# Altium integrated library dvrk-s-pwm.IntLib: 54 symbols (continued)
## CRCW04020000Z0ED (continued)

## Fiducial
designator FID?  (value not drawn)
Fiducial mark.  There is nothing to buy or mount.; SymbolCreator: codlsc; SymbolVersion: 2009-11-4; CompType: Fiducial; Publisher: National Semiconductor; LatestRevisionDate: 2011-09-19; LatestRevisionNote: Added Alternate PartNumber and Alternate Manufacturer parameters to appropriate components.; ComponentLink1URL: Paste URL for datasheet here; Manufacturer: N/A; MountType: N/A; PackageReference: Fiducial; PartNumber: N/A; ClassName: FiducialMark
footprint Fiducial10-30
footprint Fiducial10-20
footprint Fiducial15-30
footprint Fiducial20-40
footprint Fiducial6.4-20
footprint Fiducial10-30_TopLayerKeepOutOnly
footprint Fiducial6.4-20_TopLayerKeepOutOnly
footprint Fiducial10-20_TopLayerKeepOutOnly
footprint Fiducial15-30_TopLayerKeepOutOnly
footprint Fiducial20-40_TopLayerKeepOutOnly

## fpga_dummy
designator FPGA?, comment Connect to FireWire FPGA
ClassName: noclearancecheck
footprint FPGA-dummy
part A pins: 3 IO1-1 (io), 4 IO1-2 (io), 5 IO1-3 (io), 6 IO1-4 (io), 7 IO1-5 (io), 8 IO1-6 (io), 9 IO1-7 (io), 10 IO1-8 (io), 11 IO1-9 (io), 12 IO1-10 (io), 13 IO1-11 (io), 15 IO1-12 (io), 16 IO1-13 (io), 17 IO1-14 (io), 18 IO1-15 (io), 19 IO1-16 (io), 20 IO1-17 (io), 21 IO1-18 (io), 22 IO1-19 (io), 23 IO1-20 (io), 24 IO1-21 (io), 25 IO1-22 (io), 27 IO1-23 (io), 28 IO1-24 (io), 29 IO1-25 (io), 30 IO1-26 (io), 31 IO1-27 (io), 32 IO1-28 (io), 33 IO1-29 (io), 34 IO1-30 (io), 35 IO1-31 (io), 36 IO1-32 (io)
part B pins: 47 IO2-1 (io), 48 IO2-2 (io), 49 IO2-3 (io), 50 IO2-4 (io), 51 IO2-5 (io), 52 IO2-6 (io), 53 IO2-7 (io), 54 IO2-8 (io), 55 IO2-9 (io), 56 IO2-10 (io), 57 IO2-11 (io), 58 IO2-12 (io), 60 IO2-13 (io), 61 IO2-14 (io), 62 IO2-15 (io), 63 IO2-16 (io), 64 IO2-17 (io), 65 IO2-18 (io), 66 IO2-19 (io), 67 IO2-20 (io), 68 IO2-21 (io), 69 IO2-22 (io), 70 IO2-23 (io), 71 IO2-24 (io), 72 IO2-25 (io), 74 IO2-26 (io), 75 IO2-27 (io), 76 IO2-28 (io), 77 IO2-29 (io), 78 IO2-30 (io), 79 IO2-31 (io), 80 IO2-32 (io), 81 IO2-33 (io), 82 IO2-34 (io), 83 IO2-35 (io), 84 IO2-36 (io), 85 IO2-37 (io), 86 IO2-38 (io)
part C pins: 1 GND (power), 2 GND (power), 14 GND (power), 26 GND (power), 37 GND (power), 38 GND (power), 39 3.3V-OUT (power), 40 3.3V-OUT (power), 41 5V-OUT (power), 42 5V-OUT (power), 43 GND (power), 44 GND (power), 45 GND (power), 46 GND (power), 59 GND (power), 73 GND (power), 87 GND (power), 88 GND (power)

## GRM155R70J105KA12J
designator C?, comment 1µF
CAP CER 1UF 6.3V X7R 0402; Part Number: GRM155R70J105KA12J; Manufacturer: Murata Electronics; Tolerance: ±10%; Value: 1µF; Applications: General Purpose; Capacitance: 1µF; ComponentLink1Description: Datasheet; ComponentLink1URL: https://search.murata.co.jp/Ceramy/image/img/A01X/G101/ENG/GRM155R70J105KA12-01.pdf; ComponentLink2Description: DigiKey Link; ComponentLink2URL: http://digikey.com/product-detail/en/murata-electronics/GRM155R70J105KA12J/490-13339-1-ND/5973350; Device Package: 0402 (1005 Metric); LastUpdated: 9/2/2020 1:02:22 AM; Lifecycle Status: Active; Minimum Order: 1; Mounting Type: Surface Mount, MLCC; Operating Temperature: -55°C ~ 125°C; Package / Case: 0402 (1005 Metric); Packaging: TapeAndReel; PartId: 2890; Part Status: Active; Price: 0.01; Series: GRM; Size / Dimension: 0.039" L x 0.020" W (1.00mm x 0.50mm); Supplier 1: DigiKey; Supplier Part Number 1: 490-13339-1-ND; Temperature Coefficient: X7R; Thickness (Max): 0.022" (0.55mm); Voltage - Rated: 6.3V
footprint CAP 0402_1005
footprint FP-GRM155-0_05-IPC_B
pins: 1, 2

## HEADER 2
designator J?, comment Supplier Part Number 1: A19423-ND  (hidden comment: Substitute with tyco 640457-2)
TE Connectivity MTA-100 Series, 2.54mm Pitch 2 Way 1 Row Straight PCB Header, Solder Termination, 5A; system: connector; Voltage Rating: 250V; Number of Contacts: 2; Plating Thickness: 3.81um; Shrouded: No (Without); Contact Resistance: 6mR; Gender: Male; Underplate Material: Nickel; Connector Type: Plug,Header,Pin; Connector System: Wire-to-Board; PCB Mount Retention: Without; PCB Mounting Orientation: Vertical; Contact Post Length: 3.56mm; PCB Thickness: 0.063inch; Approvals: CSA; Manufacturer: TE Connectivity; Manufacturer Part Number: 640457-2; Stock 1: 10901; Pricing 1: 1=0.14, 10=0.127, 100=0.0783, 500=0.06482, 1000=0.05672, 5000=0.04862, 10000=0.04727 (USD); Mount: Through Hole; Colour: White,Natural,Beige; Contact Plating: Tin; Min Operating Temperature: -67°C; Max Operating Temperature: 221°C; Packaging: Bulk; Fastening Type: Friction; Current Rating: 5A; Contact Gender: Male; Termination: Solder; Orientation: Right Angle; Contact Current Rating: 5A; Max Voltage Rating (AC): 250V; Contact Mating Length: 0.295inch; Termination Post Length: 3.56mm; Depth: 11.04mm; Radiation Hardening: No; Flammability Rating: UL94 V-0; ELV: Compliant; Lead Free: Lead Free; REACH SVHC: Unknown; ComponentLink1URL: https://datasheet.ciiva.com/709/eng-cd-640457-s2-709682.pdf; ComponentLink1Description: https://datasheet.ciiva.com/709/eng-cd-640457-s2-709682.pdf; ComponentLink2URL: https://datasheet.ciiva.com/14640/70083657-14640359.pdf; ComponentLink2Description: https://datasheet.ciiva.com/14640/70083657-14640359.pdf; ComponentLink3URL: https://datasheet.ciiva.com/3118/eng-ds-82056-mta-0608-3118505.pdf; ComponentLink3Description: https://datasheet.ciiva.com/3118/eng-ds-82056-mta-0608-3118505.pdf; ComponentLink4URL: https://datasheet.ciiva.com/11750/0900766b806a960f-11750281.pdf; ComponentLink4Description: https://datasheet.ciiva.com/11750/0900766b806a960f-11750281.pdf; ComponentLink5URL: https://datasheet.ciiva.com/30192/8852eng-ds-82056-mta-0608-30192537.pdf; ComponentLink5Description: https://datasheet.ciiva.com/30192/8852eng-ds-82056-mta-0608-30192537.pdf; ComponentLink6URL: https://datasheet.ciiva.com/16395/eng-ds-82056-mta-0608-16395963.pdf; ComponentLink6Description: https://datasheet.ciiva.com/16395/eng-ds-82056-mta-0608-16395963.pdf; ComponentLink7URL: https://datasheet.ciiva.com/25618/0900766b80e9e25b-25618125.pdf; ComponentLink7Description: https://datasheet.ciiva.com/25618/0900766b80e9e25b-25618125.pdf; ComponentLink8URL: https://datasheet.ciiva.com/16505/eng-ds-82056-mta-0608-16505423.pdf; ComponentLink8Description: https://datasheet.ciiva.com/16505/eng-ds-82056-mta-0608-16505423.pdf; ComponentLink9URL: https://datasheet.ciiva.com/16656/eng-ds-82056-mta-0608-16656527.pdf; ComponentLink9Description: https://datasheet.ciiva.com/16656/eng-ds-82056-mta-0608-16656527.pdf; RoHS: Yes; Category: Connectors; Stock 2: 28315; Pricing 2: 1=0.10000, 10=0.09400, 100=0.05800, 500=0.04802, 1000=0.04202, 5000=0.03601, 10000=0.03501 (USD); Contact Material: Copper Alloy; Color: Natural,White,Beige; Housing Color: Natural; Housing Material: Polyester; Contact Shape: Square; Number of Rows: 1; Package Quantity: 1; Number of Positions: 2; Backwall/Post Interruptions: No (Without); Contact Retention: No (Without); Mating Alignment: No (Without); Mating Retention: No (Without); PCB Mount Alignment: No (Without); Sealable: No (Without); Strain Relief: No (Without); Contact Style: Straight; Series: MTA-100; Contact Type: Male Pin; Length: 5.08mm; Height: 7.75mm; Pitch: 2.54mm; Tail Length: 3.56mm; RoHS Compliant: Yes; ComponentLink10URL: https://datasheet.ciiva.com/15175/getdatasheetpartid-46749-15175703.pdf?src-supplier=Verical; ComponentLink10Description: https://datasheet.ciiva.com/15175/getdatasheetpartid-46749-15175703.pdf?src-supplier=Verical; ComponentLink11URL: https://datasheet.ciiva.com/16394/eng-ds-82056-mta-0608-16394202.pdf?src-supplier=Future+Electronics; ComponentLink11Description: https://datasheet.ciiva.com/16394/eng-ds-82056-mta-0608-16394202.pdf?src-supplier=Future+Electronics; ComponentLink12URL: https://datasheet.ciiva.com/6045/1650873-6045536.pdf?src-supplier=Farnell; ComponentLink12Description: https://datasheet.ciiva.com/6045/1650873-6045536.pdf?src-supplier=Farnell; ComponentLink13URL: https://datasheet.ciiva.com/11746/0900766b806b3bd3-11746906.pdf?src-supplier=RSComponents; ComponentLink13Description: https://datasheet.ciiva.com/11746/0900766b806b3bd3-11746906.pdf?src-supplier=RSComponents; ComponentLink14URL: https://datasheet.ciiva.com/7703/eng-ds-82056-mta-0608-7703518.pdf?src-supplier=Element14; ComponentLink14Description: https://datasheet.ciiva.com/7703/eng-ds-82056-mta-0608-7703518.pdf?src-supplier=Element14; ComponentLink15URL: https://datasheet.ciiva.com/3118/eng-ds-82056-mta-0608-3118490.pdf?src-supplier=Avnet; ComponentLink15Description: https://datasheet.ciiva.com/3118/eng-ds-82056-mta-0608-3118490.pdf?src-supplier=Avnet; ComponentLink16URL: https://datasheet.ciiva.com/709/eng-cd-640454-y2-709679.pdf?src-supplier=Digi-Key; ComponentLink16Description: https://datasheet.ciiva.com/709/eng-cd-640454-y2-709679.pdf?src-supplier=Digi-Key; ComponentLink17URL: https://datasheet.ciiva.com/16684/eng-ds-82056-mta-0608-16684984.pdf?src-supplier=Avnet+Europe; ComponentLink17Description: https://datasheet.ciiva.com/16684/eng-ds-82056-mta-0608-16684984.pdf?src-supplier=Avnet+Europe; Supplier 1: Digi-Key
footprint HDR-2x1-100 (Footprint not found)
pins: 1, 2

## HEADER 3
designator J?  (value not drawn)
footprint HDR-3x1-100 (Footprint not found)
pins: 1, 2, 3

## INA240A1PW
designator U?  Supplier Part Number 1: 296-45089-1-ND  Supplier Part Number 2: 595-INA240A1PWR
TEXAS INSTRUMENTS - INA240A1PWR . - CURRENT SENSE AMPLIFIER, 400KHZ, TSSOP-8; SymbolCreator: Altium; CompType: IC; U/M: EA; Number of Circuits: 1; Slew Rate: 2V/µs; Input Bias Current: 90uA; Input Offset Voltage (Vos): 5uV; Operating Supply Current: 1.8mA; SymbolVersion: 2016-01-07; PartNumber: INA240A1PW; PackageReference: PW0008A; MountType: SMT; ComponentLink1Description: Datasheet Link; ComponentLink1URL: https://sps06.itg.ti.com/sites/KMS/crossdivteams/altium/docs/ComponentDatasheets/INA240 Prelim DS - 9-15-15.pdf; Publisher: Texas Instruments; LatestRevisionDate: 2016-03-14; Manufacturer: Texas Instruments; Alternate Manufacturer: Texas Instruments; Manufacturer Part Number: INA240A1PWR; Category: Amplifiers - Op Amps, Buffer, Instrumentation; Stock 1: 14825; Pricing 1: 1=2.78000, 10=2.50000, 50=2.37000, 100=1.95000, 1000=1.40000, 10000=1.34000 (USD); Mount: Surface Mount; Case/Package: TSSOP; Min Operating Temperature: -40°C; Max Operating Temperature: 125°C; Packaging: Tape and Reel; -3db Bandwidth: 400kHz; RoHS Compliant: Yes; Lead Free: Lead Free; ComponentLink2URL: http://www.ti.com/lit/ds/symlink/ina240.pdf?src-supplier=Farnell; ComponentLink2Description: http://www.ti.com/lit/ds/symlink/ina240.pdf?src-supplier=Farnell; ComponentLink3URL: http://www.ti.com/lit/ds/symlink/ina240.pdf?src-supplier=Digi-Key; ComponentLink3Description: http://www.ti.com/lit/ds/symlink/ina240.pdf?src-supplier=Digi-Key; ComponentLink4URL: http://www.ti.com/lit/ds/symlink/ina240.pdf?src-supplier=Newark; ComponentLink4Description: http://www.ti.com/lit/ds/symlink/ina240.pdf?src-supplier=Newark; Supplier 1: Digi-Key; Supplier 2: Mouser
footprint PW0008A_N (SOP, 8-Leads, Body 4.5x3.1mm, Pitch 0.65mm, IPC Medium Density)
footprint PW0008A_M
footprint PW0008A_L
pins: 1 GND (power), 2 IN+ (in), 3 IN- (in), 4 GND (power), 5 VS (power), 6 REF2 (in), 7 REF1 (in), 8 OUT (out)

## Ind_0805
designator L?  value 100nH  Supplier Part Number 1: SRP1770TA-101MCT-ND
FIXED IND 100UH 5.3A 118 MOHM; Manufacturer: TDK; Manufacturer Part Number: MPZ2012S300AT000; Core Material: Ferrite; Impedance: 30R; Current Rating: 6A; DC Resistance (DCR): 10mR; Saturation Current: 6.5A; Shielding: Shielded; Self Resonant Frequency: 2MHz; Test Frequency: 100kHz; Tolerance: 20%; Stock 1: 117704; Pricing 1: 1=0.11, 10=0.091, 25=0.0704, 50=0.0584, 100=0.0503, 250=0.04028, 500=0.03624, 1000=0.0302 (USD); Mount: Surface Mount; Case/Package: 0805; Number of Pins: 3; Case Code (Metric): 2012; Case Code (Imperial): 0805; Packaging: Tape and Reel; Package Quantity: 1; Max DC Current: 6A; Length: 0.079inch; Height: 0.041inch; Width: 0.049inch; Depth: 1.25mm; REACH SVHC: No SVHC; Lead Free: Lead Free; ComponentLink1URL: https://datasheet.ciiva.com/46381/1750041-46381644.pdf; ComponentLink1Description: https://datasheet.ciiva.com/46381/1750041-46381644.pdf; ComponentLink2URL: https://datasheet.ciiva.com/48682/beads-commercial-power-mpz-en-48682508.pdf; ComponentLink2Description: https://datasheet.ciiva.com/48682/beads-commercial-power-mpz-en-48682508.pdf; ComponentLink3URL: https://datasheet.ciiva.com/8077/55169-8077085.pdf; ComponentLink3Description: https://datasheet.ciiva.com/8077/55169-8077085.pdf; ComponentLink4URL: https://datasheet.ciiva.com/8077/55169-8077086.pdf; ComponentLink4Description: https://datasheet.ciiva.com/8077/55169-8077086.pdf; ComponentLink5URL: https://datasheet.ciiva.com/46634/beads-commercial-power-mpz-en-46634590.pdf; ComponentLink5Description: https://datasheet.ciiva.com/46634/beads-commercial-power-mpz-en-46634590.pdf; ComponentLink6URL: https://datasheet.ciiva.com/46634/beads-commercial-power-mpz-en-46634367.pdf; ComponentLink6Description: https://datasheet.ciiva.com/46634/beads-commercial-power-mpz-en-46634367.pdf; RoHS: Yes; Category: Fixed Inductors; Stock 2: 17; Pricing 2: 1=4.17000, 10=3.82200, 25=3.47520, 50=2.91900, 100=2.50200 (USD); Min Operating Temperature: -40°C; Max Operating Temperature: 150°C; Resistor Type: Wirewound; Inductance: 100uH; RMS Current (Irms): 5.3A; Inductance Tolerance: 20%; Height - Seated (Max): 0.276inch; Ratings: AEC-Q200; RoHS Compliant: Yes; ComponentLink7URL: http://www.farnell.com/datasheets/2360566.pdf?src-supplier=Farnell; ComponentLink7Description: http://www.farnell.com/datasheets/2360566.pdf?src-supplier=Farnell; ComponentLink8URL: http://www.farnell.com/datasheets/1955470.pdf?src-supplier=Element14; ComponentLink8Description: http://www.farnell.com/datasheets/1955470.pdf?src-supplier=Element14; ComponentLink9URL: http://www.bourns.com/docs/Product-Datasheets/SRP1770TA.pdf?src-supplier=Digi-Key; ComponentLink9Description: http://www.bourns.com/docs/Product-Datasheets/SRP1770TA.pdf?src-supplier=Digi-Key; ComponentLink10URL: https://www.bourns.com/docs/Product-Datasheets/SRP1770TA.pdf?src-supplier=Digi-Key; ComponentLink10Description: https://www.bourns.com/docs/Product-Datasheets/SRP1770TA.pdf?src-supplier=Digi-Key; Supplier 1: Digi-Key
footprint SRP1770TA (Precision Wire Wound Inductor, 2-Leads, Body 16.90x16.90mm, IPC Medium Density)
pins: 1, 2

## LED_0402
designator D?  (value not drawn)
LED
footprint ROHM-SML-P11MT_V (SMD, 2-Leads, Body 0.6x1mm)
footprint LED_0402_BLUE
footprint LED_0402_ORANGE
footprint LED_0402_YELLOW
footprint LED_0402_GREEN
pins: 1 A, 2 K

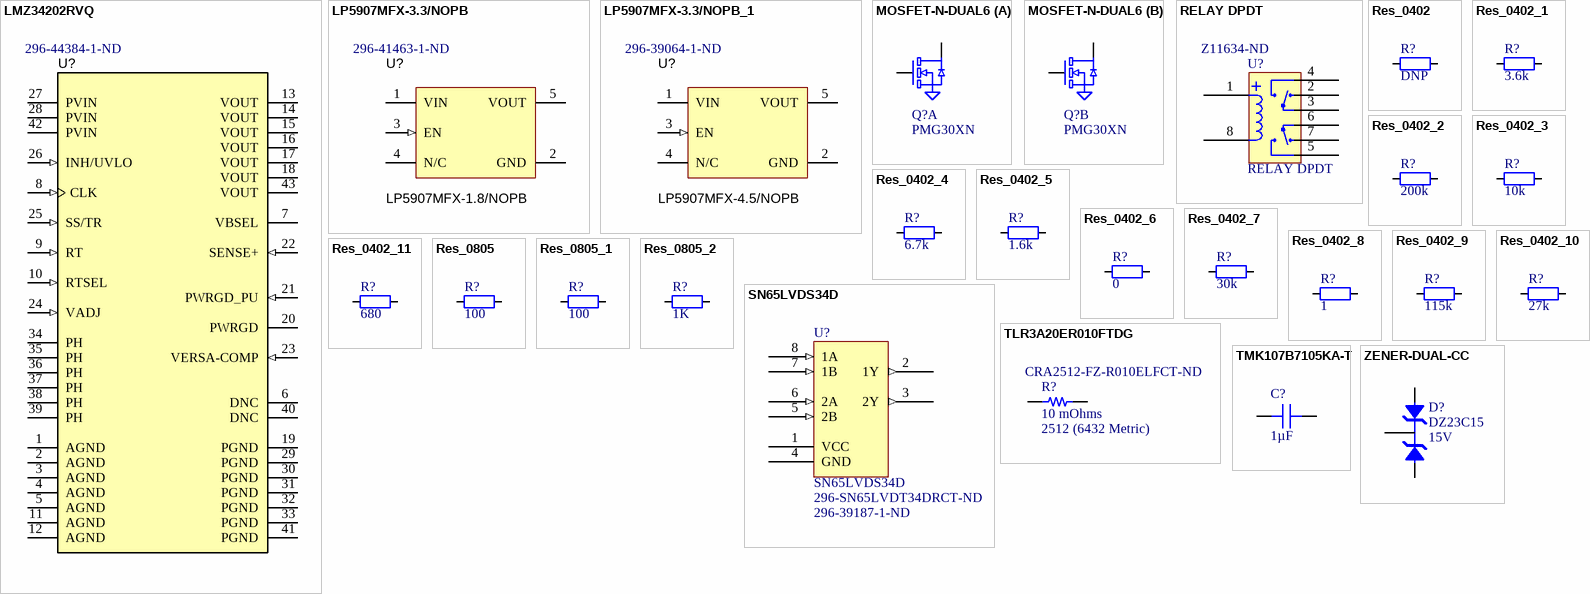
[diagram p1: symbols LMZ34202RVQ to ZENER-DUAL-CC]

## LMZ34202RVQ
designator U?  Supplier Part Number 1: 296-44384-1-ND
SIMPLE SWITCHER 4.5-V to 42-V Input, 2-A Power Module, RVQ00043A (B3QFN-43); PartNumber: LMZ34202RVQ; Manufacturer: Texas Instruments; Manufacturer Part Number: LMZ34202RVQT; SymbolCreator: Altium; SizeArea_mm2: 100; SizeAreaWB_mm2: 144; SizeX_mm: 10; SizeZ_mm: 4.4; CompType: IC; U/M: EA; Number of Outputs: 1; Min Input Voltage: 4.5V; Max Input Voltage: 42V; Voltage - Output 1: 7.5V; Max Output Current: 2A; Efficiency: 92%; SymbolVersion: 2015-09-17; PackageReference: RVQ0043A; PackageDescription: B3QFN-43; MountType: SMT; SizeY_mm: 10; ComponentLink1Description: Datasheet Link; ComponentLink1URL: https://sps06.itg.ti.com/sites/KMS/crossdivteams/altium/docs/ComponentDatasheets/lmz34202word.pdf; Publisher: Texas Instruments; LatestRevisionDate: 2016-12-29; Alternate Manufacturer: Texas Instruments; Supplier 1: Digi-Key; Stock 1: 1340; Pricing 1: 1=8.39, 5=8.27, 10=8.151, 25=7.9112, 50=7.6714, 100=7.4317 (USD); Mount: Surface Mount; Case/Package: QFN; Number of Pins: 43; Min Operating Temperature: -40°C; Max Operating Temperature: 105°C; Packaging: Cut Tape; Features: UVLO; Length: 0.39inch; Height: 0.17inch; Width: 0.39inch; Lead Free: Lead Free; REACH SVHC: No SVHC; ComponentLink2URL: http://www.ti.com/lit/ds/symlink/lmz34202.pdf; ComponentLink2Description: http://www.ti.com/lit/ds/symlink/lmz34202.pdf; ComponentLink3URL: http://www.ti.com/general/docs/lit/getliterature.tsp?genericPartNumber=LMZ34202&&fileType=pdf; ComponentLink3Description: http://www.ti.com/general/docs/lit/getliterature.tsp?genericPartNumber=LMZ34202&&fileType=pdf
footprint RVQ0043A
footprint RVQ0043A_NV
pins: 1 AGND (power), 2 AGND (power), 3 AGND (power), 4 AGND (power), 5 AGND (power), 6 DNC, 7 VBSEL (power), 8 CLK (in), 9 RT (in), 10 RTSEL (in), 11 AGND (power), 12 AGND (power), 13 VOUT (power), 14 VOUT (power), 15 VOUT (power), 16 VOUT (power), 17 VOUT (power), 18 VOUT (power), 19 PGND (power), 20 PWRGD (oc), 21 PWRGD_PU (in), 22 SENSE+ (in), 23 VERSA-COMP (in), 24 VADJ (in), 25 SS/TR (in), 26 INH/UVLO (in), 27 PVIN (power), 28 PVIN (power), 29 PGND (power), 30 PGND (power), 31 PGND (power), 32 PGND (power), 33 PGND (power), 34 PH (power), 35 PH (power), 36 PH (power), 37 PH (power), 38 PH (power), 39 PH (power), 40 DNC, 41 PGND (power), 42 PVIN (power), 43 VOUT (power)
1 alternate drawing of the same symbol

## LP5907MFX-3.3/NOPB
designator U?, comment LP5907MFX-1.8/NOPB  Supplier Part Number 1: 296-41463-1-ND
Ultra Low Noise, 250mA Linear Regulator; Manufacturer: Texas Instruments; SymbolCreator: a0799628; SizeArea_mm2: 8.12; SizeAreaWB_mm2: 14.82; SizeX_mm: 2.8; SizeY_mm: 2.9; SizeZ_mm: 1.45; CompType: IC; U/M: EA; Min Input Voltage: 2.2V; Number of Outputs: 1; Output Voltage: 1.8V; Dropout Voltage: 250mV; Max Input Voltage: 5.5V; Polarity: Positive; Quiescent Current: 25uA; Output Voltage Accuracy: 2%; Power Supply Rejection Ratio (PSRR): 82dB; Output Type: Fixed; SymbolVersion: 2014-03-21; PartNumber: LP5907MFX-1.8/NOPB; PackageReference: DBV0005A; PackageDescription: SOT-5; MountType: SMT; ComponentLink1Description: Datasheet Link; ComponentLink1URL: http://www.ti.com/lit/ds/symlink/lp5907.pdf; RoHS: Y; Publisher: Texas Instruments; LatestRevisionDate: 2016-09-20; Alternate Manufacturer: Texas Instruments; Supplier 1: Digi-Key; Manufacturer Part Number: LP5907MFX-1.8/NOPB; Category: Voltage Regulators - Linear; Stock 1: 17882; Pricing 1: 1=0.57000, 10=0.48900, 25=0.45640, 100=0.33900, 250=0.28684, 500=0.27380, 1000=0.20209 (USD); Mount: Surface Mount; Case/Package: SOT-23; Number of Pins: 5; Contact Plating: Tin; Min Operating Temperature: -40°C; Max Operating Temperature: 125°C; Packaging: Tape and Reel; Package Quantity: 3000; Output Current: 250mA; Number of Regulators: 1; Nominal Output Voltage: 1.8V; Accuracy: 2%; Max Output Current: 250mA; REACH SVHC: No SVHC; Lead Free: Lead Free; RoHS Compliant: Yes; ComponentLink2URL: https://datasheet.ciiva.com/15083/lp5907-15083594.pdf?src-supplier=Digi-Key; ComponentLink2Description: https://datasheet.ciiva.com/15083/lp5907-15083594.pdf?src-supplier=Digi-Key
footprint DBV0005A_N
footprint DBV0005A_M
footprint DBV0005A_L
pins: 1 VIN (power), 2 GND (power), 3 EN (in), 4 N/C, 5 VOUT (power)
1 alternate drawing of the same symbol

## LP5907MFX-3.3/NOPB_1
designator U?, comment LP5907MFX-4.5/NOPB  Supplier Part Number 1: 296-39064-1-ND
IC REG LINEAR 4.5V 250MA SOT23-5; Manufacturer: Texas Instruments; SymbolCreator: a0799628; SizeArea_mm2: 8.12; SizeAreaWB_mm2: 14.82; SizeX_mm: 2.8; SizeY_mm: 2.9; SizeZ_mm: 1.45; U/M: EA; Dropout Voltage: 250mV; Max Input Voltage: 5.5V; Min Input Voltage: 2.2V; Number of Outputs: 1; Polarity: Positive; Quiescent Current: 25uA; Output Voltage Accuracy: 2%; Power Supply Rejection Ratio (PSRR): 82dB; Output Type: Fixed; SymbolVersion: 2014-03-21; PartNumber: LP5907MFX-4.5/NOPB; PackageReference: DBV0005A; PackageDescription: SOT-5; MountType: SMT; ComponentLink1Description: Datasheet Link; ComponentLink1URL: http://www.ti.com/lit/ds/symlink/lp5907.pdf; CompType: IC; RoHS: Y; Publisher: Texas Instruments; LatestRevisionDate: 2016-09-20; Alternate Manufacturer: Texas Instruments; Supplier 1: Digi-Key; Manufacturer Part Number: LP5907MFX-4.5/NOPB; Category: Voltage Regulators - Linear; Stock 1: 15040; Pricing 1: 1=0.57000, 10=0.48900, 25=0.45640, 100=0.33900, 250=0.28684, 500=0.27380, 1000=0.20209 (USD); Mount: Surface Mount; Case/Package: SOT-23; Number of Pins: 5; Contact Plating: Tin; Min Operating Temperature: -40°C; Max Operating Temperature: 125°C; Output Voltage: 4.5V; Output Current: 250mA; Packaging: Tape and Reel; Package Quantity: 3000; Number of Regulators: 1; Nominal Output Voltage: 4.5V; Accuracy: 2%; Max Output Current: 250mA; REACH SVHC: No SVHC; Lead Free: Lead Free; RoHS Compliant: Yes; ComponentLink2URL: https://datasheet.ciiva.com/15083/lp5907-15083593.pdf?src-supplier=Digi-Key; ComponentLink2Description: https://datasheet.ciiva.com/15083/lp5907-15083593.pdf?src-supplier=Digi-Key
footprint DBV0005A_N
footprint DBV0005A_M
footprint DBV0005A_L
pins: 1 VIN (power), 2 GND (power), 3 EN (in), 4 N/C, 5 VOUT (power)
1 alternate drawing of the same symbol

## MOSFET-N-DUAL6
designator Q?, comment PMG30XN
footprint SC70-6
footprint SC-70-6 (Footprint not found)
part A pins: 1 S1 hidden to GND, 2 G1, 6 D1
part B pins: 3 D2, 4 S2 hidden to GND, 5 G2
1 alternate drawing of the same symbol

## RELAY DPDT
designator U?  Supplier Part Number 1: Z11634-ND
Supplier 1: Digi-Key
footprint FP-G6K-2G_DC5-MFG
pins: 1 COIL+, 2 NC, 3 COM, 4 NO, 5 NO, 6 COM, 7 NC, 8 COIL-
1 alternate drawing of the same symbol

## Res_0402
designator R?  value DNP  (hidden comment: Res_0402)
Resistor
footprint RESC1005X40X25NL05T05 (Chip Resistor, 2-Leads, Body 1.05x0.55mm, IPC Medium Density)
footprint FP-CRCW0402-e3-IPC_B
pins: 1, 2

## Res_0402_1
designator R?, comment value 3.6k  (hidden comment: Res_0402)
Resistor
footprint RESC1005X40X25NL05T05 (Chip Resistor, 2-Leads, Body 1.05x0.55mm, IPC Medium Density)
footprint FP-CRCW0402-e3-IPC_B
pins: 1, 2

## Res_0402_2
designator R?, comment value 200k  (hidden comment: Res_0402)
Resistor
footprint RESC1005X40X25NL05T05 (Chip Resistor, 2-Leads, Body 1.05x0.55mm, IPC Medium Density)
footprint FP-CRCW0402-e3-IPC_B
pins: 1, 2

## Res_0402_3
designator R?, comment value 10k  (hidden comment: Res_0402)
Resistor
footprint RESC1005X40X25NL05T05 (Chip Resistor, 2-Leads, Body 1.05x0.55mm, IPC Medium Density)
footprint FP-CRCW0402-e3-IPC_B
pins: 1, 2

## Res_0402_4
designator R?, comment value 6.7k  (hidden comment: Res_0402)
Resistor
footprint RESC1005X40X25NL05T05 (Chip Resistor, 2-Leads, Body 1.05x0.55mm, IPC Medium Density)
footprint FP-CRCW0402-e3-IPC_B
pins: 1, 2

## Res_0402_5
designator R?, comment value 1.6k  (hidden comment: Res_0402)
Resistor
footprint RESC1005X40X25NL05T05 (Chip Resistor, 2-Leads, Body 1.05x0.55mm, IPC Medium Density)
footprint FP-CRCW0402-e3-IPC_B
pins: 1, 2

## Res_0402_6
designator R?, comment value 0  (hidden comment: Res_0402)
Resistor
footprint RESC1005X40X25NL05T05 (Chip Resistor, 2-Leads, Body 1.05x0.55mm, IPC Medium Density)
footprint FP-CRCW0402-e3-IPC_B
pins: 1, 2

## Res_0402_7
designator R?, comment value 30k  (hidden comment: Res_0402)
Resistor
footprint RESC1005X40X25NL05T05 (Chip Resistor, 2-Leads, Body 1.05x0.55mm, IPC Medium Density)
footprint FP-CRCW0402-e3-IPC_B
pins: 1, 2

## Res_0402_8
designator R?, comment value 1  (hidden comment: Res_0402)
Resistor
footprint RESC1005X40X25NL05T05 (Chip Resistor, 2-Leads, Body 1.05x0.55mm, IPC Medium Density)
footprint FP-CRCW0402-e3-IPC_B
pins: 1, 2

## Res_0402_9
designator R?, comment value 115k  (hidden comment: Res_0402)
Resistor
footprint RESC1005X40X25NL05T05 (Chip Resistor, 2-Leads, Body 1.05x0.55mm, IPC Medium Density)
footprint FP-CRCW0402-e3-IPC_B
pins: 1, 2

## Res_0402_10
designator R?, comment value 27k  (hidden comment: Res_0402)
Resistor
footprint RESC1005X40X25NL05T05 (Chip Resistor, 2-Leads, Body 1.05x0.55mm, IPC Medium Density)
footprint FP-CRCW0402-e3-IPC_B
pins: 1, 2

## Res_0402_11
designator R?, comment value 680  (hidden comment: Res_0402)
Resistor
footprint RESC1005X40X25NL05T05 (Chip Resistor, 2-Leads, Body 1.05x0.55mm, IPC Medium Density)
footprint FP-CRCW0402-e3-IPC_B
pins: 1, 2

## Res_0805
designator R?  value 100  (hidden comment: Res_0805)
Resistor
footprint RESC2013X60X40NL20T25 (Chip Resistor, 2-Leads, Body 2.00x1.25mm, IPC Medium Density)
footprint FP-CRCW0805-HPe3-IPC_B
pins: 1, 2

## Res_0805_1
designator R?, comment value 100  (hidden comment: Res_0805)
Resistor
footprint RESC2013X60X40NL20T25 (Chip Resistor, 2-Leads, Body 2.00x1.25mm, IPC Medium Density)
footprint FP-CRCW0805-HPe3-IPC_B
pins: 1, 2

## Res_0805_2
designator R?, comment value 1K  (hidden comment: Res_0805)
Resistor
footprint RESC2013X60X40NL20T25 (Chip Resistor, 2-Leads, Body 2.00x1.25mm, IPC Medium Density)
footprint FP-CRCW0805-HPe3-IPC_B
pins: 1, 2

## SN65LVDS34D
designator U?  Supplier Part Number 1: 296-SN65LVDT34DRCT-ND  Supplier Part Number 2: 296-39187-1-ND
LVDS Receiver 8-Pin SOIC T/R; Manufacturer: Texas Instruments; Manufacturer Part Number: SN65LVDS34DR; Number of Receivers: 4; Operating Supply Voltage: 3.3V; Propagation Delay: 9ns; Max Power Dissipation: 950mW; Nominal Supply Current: 12mA; Max Supply Voltage: 3.6V; Min Supply Voltage: 3V; Data Rate: 400Mbps; Receiver Hysteresis: 50mV; Max Input Current: 75uA; Stock 1: 3654; Pricing 1: 1=2.27, 10=2.042, 100=1.641, 500=1.34828, 1000=1.11714 (USD); Mount: Surface Mount; Case/Package: SOIC; Number of Pins: 8; Weight: 0.002561oz; Contact Plating: Gold; Min Operating Temperature: -40°C; Max Operating Temperature: 85°C; Packaging: Tape and Reel; Package Quantity: 2500; Number of Elements: 4; Number of Drivers: 4; Turn-On Delay Time: 9ns; Power Dissipation: 950mW; Logic Function: Receiver; Lead Free: Lead Free; ComponentLink1URL: https://datasheet.ciiva.com/1770/sn65lvdt33-1770664.pdf; ComponentLink1Description: https://datasheet.ciiva.com/1770/sn65lvdt33-1770664.pdf; ComponentLink2URL: https://datasheet.ciiva.com/3152/sn65lvds33-3152872.pdf; ComponentLink2Description: https://datasheet.ciiva.com/3152/sn65lvds33-3152872.pdf; RoHS: Yes; Category: Interface ICs; Stock 2: 2291; Pricing 2: 1=2.75000, 10=2.47200, 25=2.33200, 100=1.86560, 250=1.63240, 500=1.58576, 1000=1.25928 (USD); Series: 65LVDT; Supply Current: 12mA; Radiation Hardening: No; RoHS Compliant: Yes; ComponentLink3URL: https://datasheet.ciiva.com/15133/getdatasheetpartid-524946-15133570.pdf?src-supplier=Verical; ComponentLink3Description: https://datasheet.ciiva.com/15133/getdatasheetpartid-524946-15133570.pdf?src-supplier=Verical; ComponentLink4URL: https://datasheet.ciiva.com/26828/sn65lvdt34dr-26828764.pdf?src-supplier=IIIC; ComponentLink4Description: https://datasheet.ciiva.com/26828/sn65lvdt34dr-26828764.pdf?src-supplier=IIIC; ComponentLink5URL: https://datasheet.ciiva.com/1770/sn65lvdt33-1770866.pdf?src-supplier=Digi-Key; ComponentLink5Description: https://datasheet.ciiva.com/1770/sn65lvdt33-1770866.pdf?src-supplier=Digi-Key; ComponentLink6URL: https://datasheet.ciiva.com/3153/sn65lvds33-3153018.pdf?src-supplier=Avnet; ComponentLink6Description: https://datasheet.ciiva.com/3153/sn65lvds33-3153018.pdf?src-supplier=Avnet; ComponentLink7URL: https://datasheet.ciiva.com/26002/slls490b-26002508.pdf?src-supplier=Avnet+Europe; ComponentLink7Description: https://datasheet.ciiva.com/26002/slls490b-26002508.pdf?src-supplier=Avnet+Europe; Supplier 1: Digi-Key; Supplier 2: Digi-Key
footprint D8_L (SOIC, 8-Leads, Body 4.9x3.9mm, Pitch 1.27mm, IPC High Density)
footprint D8_N
footprint SOIC127P600X175-8N
pins: 1 VCC (power), 2 1Y (out), 3 2Y (out), 4 GND (power), 5 2B (in), 6 2A (in), 7 1B (in), 8 1A (in)

## TLR3A20ER010FTDG
designator R?, comment 10 mOhms  Package / Case: 2512 (6432 Metric)  Supplier Part Number 1: CRA2512-FZ-R010ELFCT-ND
RES 0.01 OHM 1% 2W 2512; Part Number: TLR3A20ER010FTDG; Manufacturer: TE Connectivity Passive Product; Temperature Coefficient: ±100ppm/°C; ComponentLink1Description: Datasheet; ComponentLink1URL: https://www.te.com/commerce/DocumentDelivery/DDEController?Action=srchrtrv&DocNm=1773449-3&DocType=DS&DocLang=English; ComponentLink2Description: DigiKey Link; ComponentLink2URL: http://digikey.com/product-detail/en/te-connectivity-passive-product/TLR3A20ER010FTDG/A129568CT-ND/8566772; Composition: Metal Foil; Device Package: 2512 (6432 Metric); Features: Current Sense; Height - Seated (Max): 0.024" (0.60mm); LastUpdated: 9/2/2020 1:18:04 AM; Lifecycle Status: Active; Minimum Order: 1; Number of Terminations: 2; Operating Temperature: -55°C ~ 170°C; Packaging: TapeAndReel; PartId: 1895; Part Status: Active; Power (Watts): 2W; Price: 0.30; Resistance: 10 mOhms; Series: TLR, CGS; Size / Dimension: 0.252" L x 0.126" W (6.40mm x 3.20mm); Supplier Device Package: 2512; Tolerance: ±1%; Value: 10 mOhms; Supplier 1: Digi-Key
footprint STACKPOLE CSR2512
pins: 1, 2

## TMK107B7105KA-T
designator C?, comment 1µF
CAP CER 1UF 25V X7R 0603; Part Number: TMK107B7105KA-T; Manufacturer: Taiyo Yuden; Tolerance: ±10%; Value: 1µF; Applications: General Purpose; Capacitance: 1µF; ComponentLink1Description: Datasheet; ComponentLink1URL: https://www.yuden.co.jp/productdata/catalog/mlcc01_e.pdf; ComponentLink2Description: DigiKey Link; ComponentLink2URL: http://digikey.com/product-detail/en/taiyo-yuden/TMK107B7105KA-T/587-2984-1-ND/2714177; Device Package: 0603 (1608 Metric); LastUpdated: 9/2/2020 1:03:30 AM; Lifecycle Status: Active; Minimum Order: 1; Mounting Type: Surface Mount, MLCC; Operating Temperature: -55°C ~ 125°C; Package / Case: 0603 (1608 Metric); Packaging: TapeAndReel; PartId: 5586; Part Status: Active; Price: 0.01; Series: M; Size / Dimension: 0.063" L x 0.031" W (1.60mm x 0.80mm); Supplier 1: DigiKey; Supplier Part Number 1: 587-2984-1-ND; Temperature Coefficient: X7R; Thickness (Max): 0.035" (0.90mm); Voltage - Rated: 25V
footprint CAP 0603_1608
footprint FP-GRM188-0_1-e0_2_0_55-IPC_B
pins: 1, 2

## ZENER-DUAL-CC
designator D?, comment DZ23C15  Voltage: 15V
footprint SOT-23
pins: 1 A2, 2 A1, 3 A1